# Altium footprint library Passive Pad Lib.PcbLib: 110 footprints (part 2 of 7)
Each footprint in its own frame and in the unit in brackets; x right, y up, seen from the top. Pads: shape width x height; smd on the part's side, far side on the other; paste and mask are expansions set on the pad; w line width, h text height; cw(c..) or ccw(c..) is an arc to the next point about the centre after c.
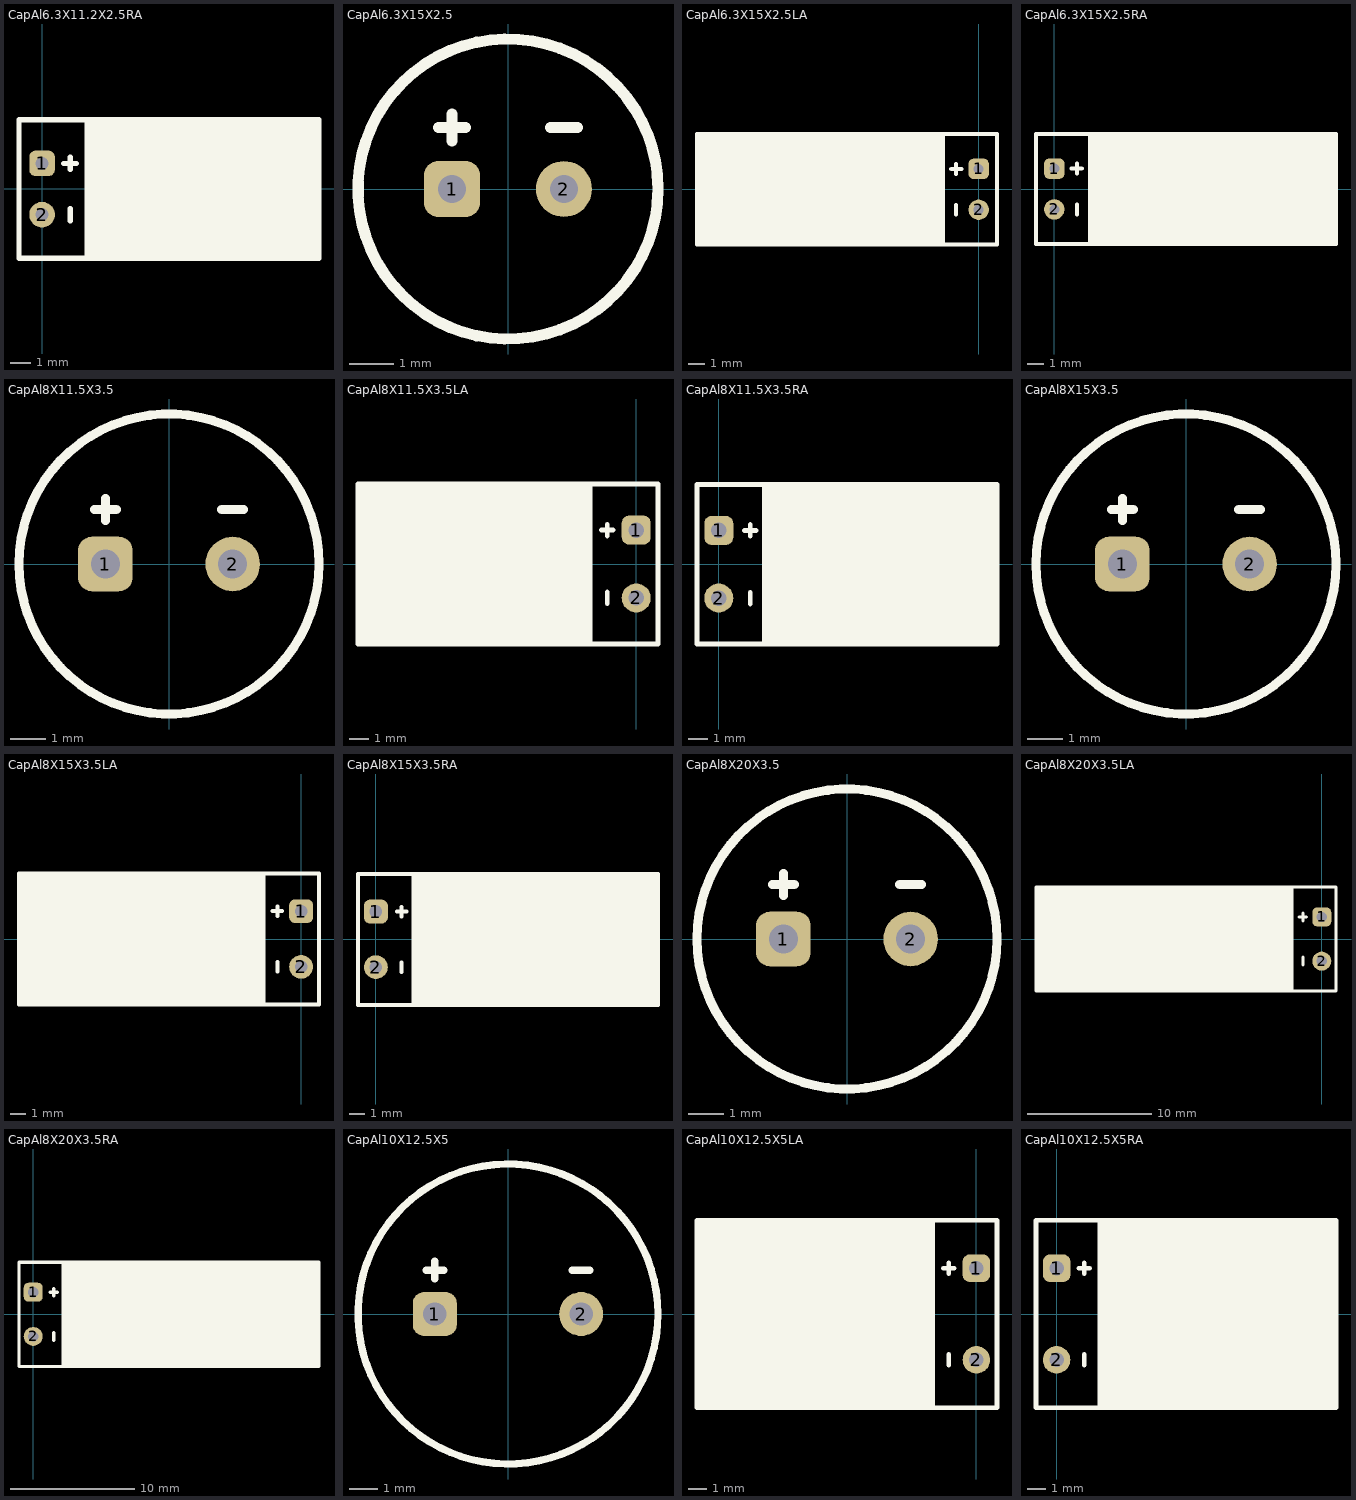
[diagram p1: the footprints below, top view; thin cyan lines are the x and y axes]

## CapAl6.3X11.2X2.5RA [mil] "Aluminum Electrolytic Capacitors (Size:6.3X11.2X2.5mm, Angled Right)"
pads (2):
  rrect50% 50x50 hole 25: 1(0,50)
  round 50 hole 25: 2(0,-50)
Top Overlay:
  region: 82.5,134 82.5,-134 539.5,-134 539.5,134
  lines w10: 42,50 67,50 ; 55,-62 55,-38 ; 55,38 55,62 ; -45,-135 -45,135 540,135 540,-135 -45,-135
3D body "THD Capacitor Polar 6.3x11.2x2.5mm RA.STEP": height 255.02, standoff -106.22, extent -10.5,-125.02 539.63,125.01

## CapAl6.3X15X2.5 [mil] "Aluminum Electrolytic Capacitors (Size:6.3X15X2.5mm,Straight)"
pads (2):
  rrect50% 50x50 hole 25: 1(-50,0)
  round 50 hole 25: 2(50,0)
Top Overlay:
  circle w10: c0,0 r134
  lines w10: -62,55 -38,55 ; -50,43 -50,67 ; 38,55 62,55
3D body "THD Capacitor Polar 6.3x15x2.5mm.STEP": height 606.24, standoff -133.81, extent -125.01,-125.01 125.02,125.02

## CapAl6.3X15X2.5LA [mil] "Aluminum Electrolytic Capacitors (Size:6.3X15X2.5mm, Angled Left)"
pads (2):
  rrect50% 50x50 hole 25: 1(0,50)
  round 50 hole 25: 2(0,-50)
Top Overlay:
  region: -82.5,-133.5 -82.5,135 -690,135 -690,-133.5
  lines w10: -67,50 -42,50 ; -55,-62 -55,-38 ; -55,38 -55,62 ; -690,-135 45,-135 45,135 -690,135 -690,-135
3D body "THD Capacitor Polar 6.3x15x2.5mm LA.STEP": height 255.02, standoff -106.22, extent -689.24,-125.01 10.5,125.02

## CapAl6.3X15X2.5RA [mil] "Aluminum Electrolytic Capacitors (Size:6.3X15X2.5mm, Angled Right)"
pads (2):
  rrect50% 50x50 hole 25: 1(0,50)
  round 50 hole 25: 2(0,-50)
Top Overlay:
  region: 82.5,134 82.5,-134 690,-134 690,134
  lines w10: 42,50 67,50 ; 55,-62 55,-38 ; 55,38 55,62 ; -45,-135 690,-135 690,135 -45,135 -45,-135
3D body "THD Capacitor Polar 6.3x15x2.5mm RA.STEP": height 255.02, standoff -106.22, extent -10.5,-125.02 689.24,125.01

## CapAl8X11.5X3.5 [mil] "Aluminum Electrolytic Capacitors (Size:8X11.5X3.5mm,Straight)"
pads (2):
  rrect50% 60x60 hole 32: 1(-70,0)
  round 60 hole 32: 2(70,0)
Top Overlay:
  circle w10: c0,0 r165
  lines w10: -82,60 -58,60 ; -70,48 -70,72 ; 58,60 82,60
3D body "THD Capacitor Polar 8x11.5x3.5mm.step": height 468.44, standoff -133.81, extent -158.48,-158.48 158.48,158.48

## CapAl8X11.5X3.5LA [mil] "Aluminum Electrolytic Capacitors (Size:8X11.5X3.5mm, Angled Left)"
pads (2):
  rrect50% 60x60 hole 32: 1(0,70)
  round 60 hole 32: 2(0,-70)
Top Overlay:
  region: -90,-165 -90,165 -575,165 -575,-165
  lines w10: -72,70 -48,70 ; -60,-82 -60,-58 ; -60,58 -60,82 ; -575,-165 -575,165 45,165 45,-165 -575,-165
3D body "THD Capacitor Polar 8x11.5x3.5mm LA.step": height 323.48, standoff -104.69, extent -553.44,-158.48 10.46,158.48

## CapAl8X11.5X3.5RA [mil] "Aluminum Electrolytic Capacitors (Size:8X11.5X3.5mm, Angled Right)"
pads (2):
  rrect50% 60x60 hole 32: 1(0,70)
  round 60 hole 32: 2(0,-70)
Top Overlay:
  region: 89.5,165 89.5,-164 575,-164 575,165
  lines w10: 53,70 77,70 ; 65,-82 65,-58 ; 65,58 65,82 ; -45,-165 -45,165 575,165 575,-165 -45,-165
3D body "THD Capacitor Polar 8x11.5x3.5mm RA.step": height 323.48, standoff -104.69, extent -10.46,-158.48 553.44,158.48

## CapAl8X15X3.5 [mil] "Aluminum Electrolytic Capacitors (Size:8X15X3.5mm,Straight)"
pads (2):
  rrect50% 60x60 hole 32: 1(-70,0)
  round 60 hole 32: 2(70,0)
Top Overlay:
  circle w10: c0,0 r165
  lines w10: -82,60 -58,60 ; -70,48 -70,72 ; 58,60 82,60
3D body "THD Capacitor Polar 8x15x3.5mm.step": height 606.24, standoff -133.81, extent -158.48,-158.48 158.48,158.48

## CapAl8X15X3.5LA [mil] "Aluminum Electrolytic Capacitors (Size:8X15X3.5mm, Angled Left)"
pads (2):
  rrect50% 60x60 hole 32: 1(0,70)
  round 60 hole 32: 2(0,-70)
Top Overlay:
  region: -90,-165 -90,165 -710,165 -710,-165
  lines w10: -72,70 -48,70 ; -60,-82 -60,-58 ; -60,58 -60,82 ; -710,-165 -710,165 45,165 45,-165 -710,-165
3D body "THD Capacitor Polar 8x15x3.5mm LA.step": height 323.48, standoff -104.69, extent -708.23,-158.48 13.32,158.48

## CapAl8X15X3.5RA [mil] "Aluminum Electrolytic Capacitors (Size:8X15X3.5mm, Angled Right)"
pads (2):
  rrect50% 60x60 hole 32: 1(0,70)
  round 60 hole 32: 2(0,-70)
Top Overlay:
  region: 89.5,166 89.5,-164 709.5,-164 709.5,166
  lines w10: 53,70 77,70 ; 65,-82 65,-58 ; 65,58 65,82 ; -45,-165 710,-165 710,165 -45,165 -45,-165
3D body "THD Capacitor Polar 8x15x3.5mm RA.step": height 323.48, standoff -104.69, extent -13.15,-158.48 708.24,158.48

## CapAl8X20X3.5 [mil] "Aluminum Electrolytic Capacitors (Size:8X20X3.5mm,Straight)"
pads (2):
  rrect50% 60x60 hole 32: 1(-70,0)
  round 60 hole 32: 2(70,0)
Top Overlay:
  circle w10: c0,0 r165
  lines w10: -82,60 -58,60 ; -70,48 -70,72 ; 58,60 82,60
3D body "THD Capacitor Polar 8x20x3.5mm.step": height 803.09, standoff -133.81, extent -158.48,-158.48 158.48,158.48

## CapAl8X20X3.5LA [mil] "Aluminum Electrolytic Capacitors (Size:8X20X3.5mm, Angled Left)"
pads (2):
  rrect50% 60x60 hole 32: 1(0,70)
  round 60 hole 32: 2(0,-70)
Top Overlay:
  region: -90,-165 -90,165 -905,165 -905,-165
  lines w10: -72,70 -48,70 ; -60,-82 -60,-58 ; -60,58 -60,82 ; -905,-165 -905,165 45,165 45,-165 -905,-165
3D body "THD Capacitor Polar 8x20x3.5mm LA.step": height 323.48, standoff -104.69, extent -905.08,-158.48 13.32,158.48

## CapAl8X20X3.5RA [mil] "Aluminum Electrolytic Capacitors (Size:8X20X3.5mm, Angled Right)"
pads (2):
  rrect50% 60x60 hole 32: 1(0,70)
  round 60 hole 32: 2(0,-70)
Top Overlay:
  region: 89.5,166 89.5,-164 905,-164 905,166
  lines w10: 53,70 77,70 ; 65,-82 65,-58 ; 65,58 65,82 ; -45,-165 905,-165 905,165 -45,165 -45,-165
3D body "THD Capacitor Polar 8x20x3.5mm RA.step": height 323.48, standoff -104.69, extent -13.15,-158.48 905.09,158.48

## CapAl10X12.5X5 [mil] "Aluminum Electrolytic Capacitors (Size:10X12.5X5mm,Straight)"
pads (2):
  rrect50% 60x60 hole 32: 1(-100,0)
  round 60 hole 32: 2(100,0)
Top Overlay:
  circle w10: c0,0 r205
  lines w10: -112,60 -88,60 ; -100,48 -100,72 ; 88,60 112,60
3D body "THD Capacitor Polar 10x12.5x5mm.step": height 507.81, standoff -133.81, extent -197.85,-197.85 197.85,197.85

## CapAl10X12.5X5LA [mil] "Aluminum Electrolytic Capacitors (Size:10X12.5X5mm, Angled Left)"
pads (2):
  rrect50% 60x60 hole 32: 1(0,100)
  round 60 hole 32: 2(0,-100)
Top Overlay:
  region: -90,-205 -90,205 -610,205 -610,-205
  lines w10: -72,100 -48,100 ; -60,-112 -60,-88 ; -60,88 -60,112 ; -610,-205 -610,205 45,205 45,-205 -610,-205
3D body "THD Capacitor Polar 10x12.5x5mm LA.step": height 397.85, standoff -174.02, extent -610.81,-197.85 12.32,197.85

## CapAl10X12.5X5RA [mil] "Aluminum Electrolytic Capacitors (Size:10X12.5X5mm, Angled Right)"
pads (2):
  rrect50% 60x60 hole 32: 1(0,100)
  round 60 hole 32: 2(0,-100)
Top Overlay:
  region: 89.5,205 89.5,-205 610,-205 610,205
  lines w10: 48,100 72,100 ; 60,-112 60,-88 ; 60,88 60,112 ; -45,-205 -45,205 610,205 610,-205 -45,-205
3D body "THD Capacitor Polar 10x12.5x5mm RA.step": height 397.85, standoff -156.3, extent -12.15,-197.85 610.81,197.85